# Altium footprint library GyokuRe.PcbLib: 1248 footprints (part 16 of 78)
Each footprint in its own frame and in the unit in brackets; x right, y up, seen from the top. Pads: shape width x height; smd on the part's side, far side on the other; paste and mask are expansions set on the pad; w line width, h text height; cw(c..) or ccw(c..) is an arc to the next point about the centre after c.
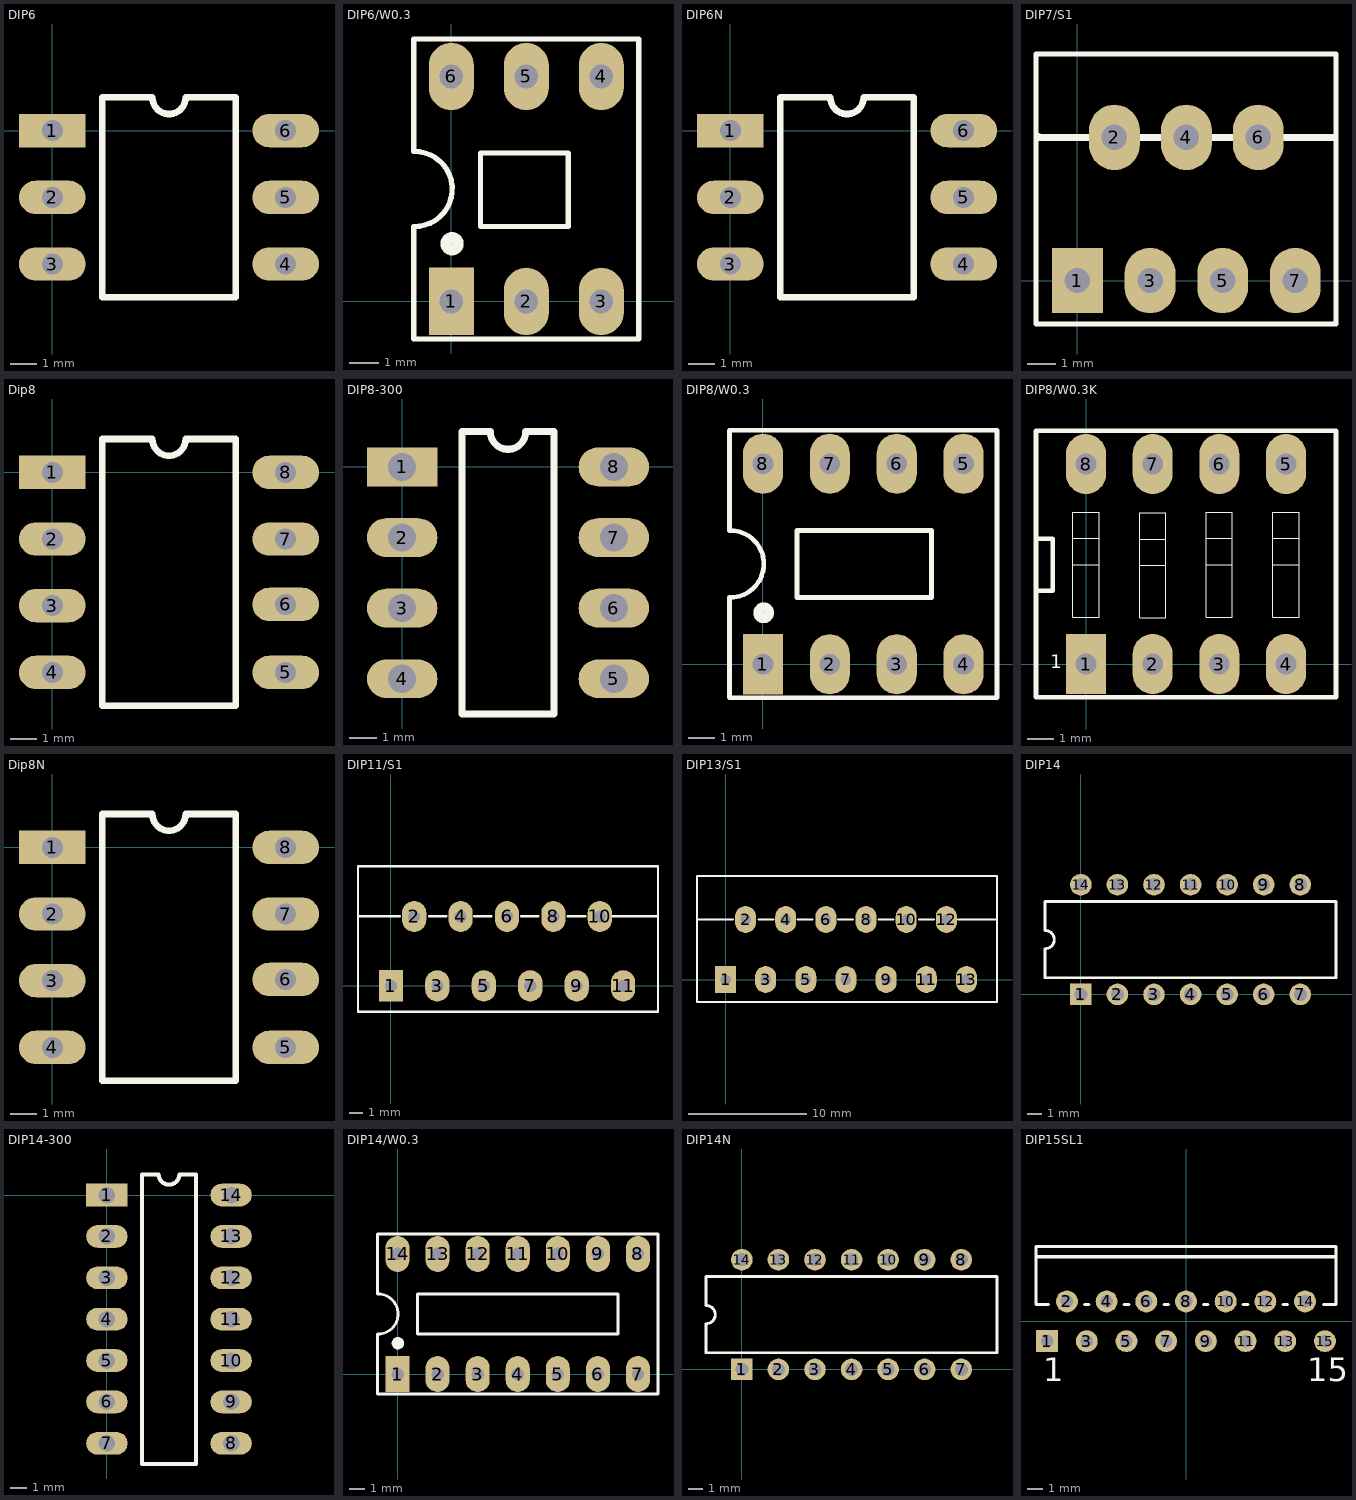
[diagram p15: the footprints below, top view; thin cyan lines are the x and y axes]

## DIP6 [mm]
pads (6):
  rect 2.54x1.27 hole 0.8: 1(0,0)
  oval 2.54x1.27 hole 0.8: 2(0,-2.54) 3(0,-5.08) 4(8.89,-5.08) 5(8.89,-2.54) 6(8.89,0)
Top Overlay:
  lines w0.254: 1.905,-6.35 6.985,-6.35 6.985,1.27 5.08,1.27 cw(c4.445,1.27) 3.81,1.27 1.905,1.27 1.905,-6.35
3D body: height 5.3, standoff 0.3, extent 1.905,-6.35 6.985,1.287
3D body: height 3, standoff 2.65, extent 0.205,-0.75 1.905,0.75
3D body: height 3, standoff 0.5, extent 0.03,-0.75 0.38,0.75
3D body: height 0.5, standoff -3.8, extent 0.03,-0.275 0.38,0.275
3D body: height 3, standoff 2.65, extent 0.205,-3.29 1.905,-1.79
3D body: height 3, standoff 0.5, extent 0.03,-3.29 0.38,-1.79
3D body: height 0.5, standoff -3.8, extent 0.03,-2.815 0.38,-2.265
3D body: height 3, standoff 2.65, extent 0.205,-5.83 1.905,-4.33
3D body: height 3, standoff 0.5, extent 0.03,-5.83 0.38,-4.33
3D body: height 0.5, standoff -3.8, extent 0.03,-5.355 0.38,-4.805
3D body: height 3, standoff 2.65, extent 6.985,-5.83 8.685,-4.33
3D body: height 3, standoff 0.5, extent 8.51,-5.83 8.86,-4.33
3D body: height 0.5, standoff -3.8, extent 8.51,-5.355 8.86,-4.805
3D body: height 3, standoff 2.65, extent 6.985,-3.29 8.685,-1.79
3D body: height 3, standoff 0.5, extent 8.51,-3.29 8.86,-1.79
3D body: height 0.5, standoff -3.8, extent 8.51,-2.815 8.86,-2.265
3D body: height 3, standoff 2.65, extent 6.985,-0.75 8.685,0.75
3D body: height 3, standoff 0.5, extent 8.51,-0.75 8.86,0.75
3D body: height 0.5, standoff -3.8, extent 8.51,-0.275 8.86,0.275
3D body: height 5.4, standoff 4, extent 3.449,0.287 5.449,1.287

## DIP6/W0.3 [mil] "6 PIN, W 300mil, Pin to pin 100mil"
height 100
pads (6):
  rect 60x90 hole 31.5: 1(0,0)
  oval 60x90 hole 31.5: 2(100,0) 3(200,0) 4(200,300) 5(100,300) 6(0,300)
Top Overlay:
  circle w15: c1,77 r8
  lines w7: -50.38,100.05 ccw(c-48.69,150.02) -50,200 ; -50,100 -50,-50 250,-50 250,350 -50,350 -50,201 ; 39,100 39,198 156,198 156,100 39,100
3D body "SW3DPS-DIP6-DEFAULT.STEP": height 169.69, standoff -129.13, extent -58.11,-7.48 260,307.48

## DIP6N [mm]
pads (6):
  rect 2.54x1.27 hole 0.8: 1(0,0)
  oval 2.54x1.27 hole 0.8: 2(0,-2.54) 3(0,-5.08) 4(8.89,-5.08) 5(8.89,-2.54) 6(8.89,0)
Top Overlay:
  lines w0.254: 1.905,-6.35 6.985,-6.35 6.985,1.27 5.08,1.27 cw(c4.445,1.27) 3.81,1.27 1.905,1.27 1.905,-6.35
3D body "DIP6.STEP": height 4.51, standoff -3.08, extent 0.475,-6.53 8.475,1.55

## DIP7/S1 [mil]
pads (7):
  rect 70x90 hole 35: 1(0,0)
  oval 70x90 hole 35: 2(51,197) 3(100,0) 4(150,197) 5(200,0) 6(249,197) 7(300,0)
Top Overlay:
  lines w7: -57,-60 -57,312 356,312 356,-60 -57,-60
  lines w10: -54,198 -54,197 354,197
3D body "User Library-TO-220(T).STEP": height 756.77, standoff -77.87, extent -50.57,-11.02 351,311.02

## Dip8 [mm] "Dual Inline Package 8 pins"
pads (8):
  rect 2.54x1.27 hole 0.8: 1(0,0)
  oval 2.54x1.27 hole 0.8: 2(0,-2.54) 3(0,-5.08) 4(0,-7.62) 5(8.89,-7.62) 6(8.89,-5.03) 7(8.89,-2.54) 8(8.89,0)
Top Overlay:
  lines w0.254: 1.905,-8.89 6.985,-8.89 6.985,1.27 5.08,1.27 cw(c4.445,1.27) 3.81,1.27 1.905,1.27 1.905,-8.89
3D body: height 0.5, standoff -3.8, extent 8.42,-7.945 8.77,-7.395
3D body: height 3, standoff 0.5, extent 8.42,-8.42 8.77,-6.92
3D body: height 3, standoff 2.65, extent 6.895,-8.37 8.595,-6.87
3D body: height 3, standoff 2.65, extent 0.205,-8.37 1.905,-6.87
3D body: height 5.3, standoff 0.3, extent 1.905,-8.89 6.985,1.27
3D body: height 3, standoff 2.65, extent 0.205,-0.75 1.905,0.75
3D body: height 3, standoff 0.5, extent 0.03,-0.75 0.38,0.75
3D body: height 0.5, standoff -3.8, extent 0.03,-0.275 0.38,0.275
3D body: height 3, standoff 2.65, extent 0.205,-3.29 1.905,-1.79
3D body: height 3, standoff 0.5, extent 0.03,-3.29 0.38,-1.79
3D body: height 0.5, standoff -3.8, extent 0.03,-2.815 0.38,-2.265
3D body: height 3, standoff 2.65, extent 0.205,-5.83 1.905,-4.33
3D body: height 3, standoff 0.5, extent 0.03,-5.83 0.38,-4.33
3D body: height 0.5, standoff -3.8, extent 0.03,-5.355 0.38,-4.805
3D body: height 3, standoff 2.65, extent 6.895,-5.83 8.595,-4.33
3D body: height 3, standoff 0.5, extent 8.42,-5.83 8.77,-4.33
3D body: height 0.5, standoff -3.8, extent 8.42,-5.355 8.77,-4.805
3D body: height 3, standoff 2.65, extent 6.895,-3.29 8.595,-1.79
3D body: height 3, standoff 0.5, extent 8.42,-3.29 8.77,-1.79
3D body: height 0.5, standoff -3.8, extent 8.42,-2.815 8.77,-2.265
3D body: height 3, standoff 2.65, extent 6.895,-0.75 8.595,0.75
3D body: height 3, standoff 0.5, extent 8.42,-0.75 8.77,0.75
3D body: height 0.5, standoff -3.8, extent 8.42,-0.275 8.77,0.275
3D body: height 0.5, standoff -3.8, extent 0.03,-7.895 0.38,-7.345
3D body: height 3, standoff 0.5, extent 0.03,-8.37 0.38,-6.87
3D body: height 5.4, standoff 4, extent 3.449,0.27 5.449,1.27

## DIP8-300 [mil]
pads (8):
  rect 100x55 hole 40: 1(0,0)
  oval 100x55 hole 40: 2(0,-100) 3(0,-200) 4(0,-300) 5(300,-300) 6(300,-200) 7(300,-100) 8(300,0)
Top Overlay:
  lines w10: 85,-350 215,-350 215,50 175,50 cw(c150,50) 125,50 85,50 85,-350
3D body "SW3DPS-DIP 8 IC-DEFAULT.STEP": height 200, standoff -137.8, extent -6.92,-360.96 302.93,68.96

## DIP8/W0.3 [mil] "8 PIN, W 300mil, Pin to pin 100mil"
height 100
pads (8):
  rect 60x90 hole 31: 1(0,0)
  oval 60x90 hole 31: 2(100,0) 3(200,0) 4(300,0) 5(300,300) 6(200,300) 7(100,300) 8(0,300)
Top Overlay:
  circle w15: c1,77 r8
  lines w7: -50.38,100.05 ccw(c-48.69,150.02) -50,200 ; -50,100 -50,-50 350,-50 350,350 -50,350 -50,201 ; 51,100 51,200 252,200 252,100 51,100
3D body "SW3dPS-DIP8-CER.STEP": height 201.25, standoff -129.47, extent -50,-40 350,336.4

## DIP8/W0.3K [mil] "8 PIN, W 400mil , L 450mil, Pin to pin 100mil For Switch"
height 100
pads (8):
  rect 60x90 hole 31: 1(0,0)
  oval 60x90 hole 31: 2(100,0) 3(200,0) 4(300,0) 5(300,300) 6(200,300) 7(100,300) 8(0,300)
Top Overlay:
  lines w1.5: -19.68,149 19.68,149 ; -19.68,188.37 19.68,188.37 ; 80.31,148 119.69,148 ; 80.31,187.37 119.69,187.37 ; 180.31,149 219.69,149 ; 180.31,188.37 219.69,188.37 ; 280.31,149 319.69,149 ; 280.31,188.37 319.69,188.37 ; -19.68,70.26 19.68,70.26 19.68,227.74 -19.68,227.74 -19.68,70.26 ; 80.31,69.26 119.69,69.26 119.69,226.74 80.31,226.74 80.31,69.26 ; 180.31,70.26 219.69,70.26 219.69,227.74 180.31,227.74 180.31,70.26 ; 280.31,70.26 319.69,70.26 319.69,227.74 280.31,227.74 280.31,70.26
  lines w7: -75,68.5 -75,233 ; -75,110 -50,110 -50,188 -74,188 -75,189 ; -75,126 -75,-50 375,-50 375,350 -75,350 -75,176
  text "1" at -54,-6 h20
3D body "switch 4bank x1.STEP": height 158.27, standoff -9.84, extent -80,-45.08 377.87,345.08

## Dip8N [mm] "Dual Inline Package 8 pins"
pads (8):
  rect 2.54x1.27 hole 0.8: 1(0,0)
  oval 2.54x1.27 hole 0.8: 2(0,-2.54) 3(0,-5.08) 4(0,-7.62) 5(8.89,-7.62) 6(8.89,-5.03) 7(8.89,-2.54) 8(8.89,0)
Top Overlay:
  lines w0.254: 1.905,-8.89 1.905,1.27 3.81,1.27 ccw(c4.445,1.27) 5.08,1.27 6.985,1.27 6.985,-8.89 1.905,-8.89
3D body "DIP8.STEP": height 5.19, standoff -1.67, extent 0.538,-9.55 8.412,1.88

## DIP11/S1 [mil] "11 Pin so le hai hang cach nhau 200mil., Pin to pin 100mil"
pads (11):
  rect 70x90 hole 35: 1(0,0)
  oval 70x90 hole 35: 2(66.93,200) 3(133.86,0) 4(200.79,200) 5(267.72,0) 6(334.65,200) 7(401.57,0) 8(468.5,200) 9(535.43,0) 10(602.36,200) 11(669.29,0)
Top Overlay:
  lines w7: -95,200 25,200 ; 110,200 160,200 ; 240,200 290,200 ; 375,200 425,200 ; 510,200 560,200 ; 630,200 770,200 ; -95,-75 -95,345 770,345 770,-75 -95,-75

## DIP13/S1 [mil] "13 Pin so le hai hang cach nhau 200mil., Pin to pin 100mil"
pads (13):
  rect 70x90 hole 35: 1(0,0)
  oval 70x90 hole 35: 2(66.93,200) 3(133.86,0) 4(200.79,200) 5(267.72,0) 6(334.65,200) 7(401.57,0) 8(468.5,200) 9(535.43,0) 10(602.36,200) 11(669.29,0) 12(736.22,200) 13(803.15,0)
Top Overlay:
  lines w7: -95,200 25,200 ; 110,200 160,200 ; 240,200 290,200 ; 375,200 425,200 ; 510,200 560,200 ; 645,200 695,200 ; 775,200 905,200 ; -95,-75 -95,345 905,345 905,-75 -95,-75

## DIP14 [mm] "DIP; 14 Leads; Row Spacing 7.62 mm; Pitch 2.54 mm"
height 4.42
pads (14):
  rect 1.5x1.5 hole 0.9: 1(0,0)
  round 1.5 hole 0.9: 2(2.54,0) 3(5.08,0) 4(7.62,0) 5(10.16,0) 6(12.7,0) 7(15.24,0) 8(15.24,7.62) 9(12.7,7.62) 10(10.16,7.62) 11(7.62,7.62) 12(5.08,7.62) 13(2.54,7.62) 14(0,7.62)
Top Overlay:
  lines w0.2: -2.48,1.16 17.72,1.16 17.72,6.46 -2.48,6.46 -2.48,4.445 cw(c-2.48,3.81) -2.48,3.175 -2.48,1.16
Bottom Overlay:
  lines w0.254: -1.475,-1.175 17,-1.175 17,8.875 -1.475,8.875 -1.475,-1.175

## DIP14-300 [mil]
pads (14):
  rect 100x55 hole 40: 1(0,0)
  oval 100x55 hole 40: 2(0,-100) 3(0,-200) 4(0,-300) 5(0,-400) 6(0,-500) 7(0,-600) 8(300,-600) 9(300,-500) 10(300,-400) 11(300,-300) 12(300,-200) 13(300,-100) 14(300,0)
Top Overlay:
  lines w10: 85,-650 215,-650 215,50 175,50 cw(c150,50) 125,50 85,50 85,-650
3D body "SW3dPS-DIP14-300.STEP": height 200, standoff -98.03, extent -4.92,-683.86 304.92,83.86

## DIP14/W0.3 [mil] "14PIN, W 300mil, Pin to pin 100mil"
height 100
pads (14):
  rect 60x90 hole 31: 1(0,0)
  oval 60x90 hole 31: 2(100,0) 3(200,0) 4(300,0) 5(400,0) 6(500,0) 7(600,0) 8(600,300) 9(500,300) 10(400,300) 11(300,300) 12(200,300) 13(100,300) 14(0,300)
Top Overlay:
  circle w15: c1,77 r8
  lines w7: -50.38,100.05 ccw(c-48.69,150.02) -50,200 ; -50,100 -50,-50 650,-50 650,350 -50,350 -50,201 ; 50,100 550,100 550,200 50,200 50,100
3D body "SW3DPS-DIP-14-DEFAULT.STEP": height 145.48, standoff -129.32, extent -69.99,-12.47 680.01,302.49

## DIP14N [mm] "DIP; 14 Leads; Row Spacing 7.62 mm; Pitch 2.54 mm"
height 4.42
pads (14):
  rect 1.5x1.5 hole 0.9: 1(0,0)
  round 1.5 hole 0.9: 2(2.54,0) 3(5.08,0) 4(7.62,0) 5(10.16,0) 6(12.7,0) 7(15.24,0) 8(15.24,7.62) 9(12.7,7.62) 10(10.16,7.62) 11(7.62,7.62) 12(5.08,7.62) 13(2.54,7.62) 14(0,7.62)
Top Overlay:
  lines w0.2: -2.48,1.16 -2.48,3.175 ccw(c-2.48,3.81) -2.48,4.445 -2.48,6.46 17.72,6.46 17.72,1.16 -2.48,1.16
Bottom Overlay:
  lines w0.254: -2.25,-1.175 -2.25,8.875 17.55,8.875 17.55,-1.175 -2.25,-1.175
3D body "DIP14-300.STEP": height 5.58, standoff -1.99, extent -2.25,-0.145 17.25,7.725

## DIP15SL1 [mm] "TO, Thru-Hole, Vertical, Heatsink Mounted; 15 Bent Staggered Leads; Pitch 1.27 mm"
height 17.3
pads (15):
  rect 1.4x1.4 hole 0.8: 1(-8.89,-1.27)
  round 1.4 hole 0.8: 2(-7.62,1.27) 3(-6.35,-1.27) 4(-5.08,1.27) 5(-3.81,-1.27) 6(-2.54,1.27) 7(-1.27,-1.27) 8(0,1.27) 9(1.27,-1.27) 10(2.54,1.27) 11(3.81,-1.27) 12(5.08,1.27) 13(6.35,-1.27) 14(7.62,1.27) 15(8.89,-1.27)
Top Overlay:
  lines w0.2: -9.6,4.13 9.6,4.13 ; -8.8,1.08 -9.6,1.08 -9.6,4.78 9.6,4.78 9.6,1.08 8.8,1.08 ; -6.5,1.08 -6.2,1.08 ; -3.96,1.08 -3.66,1.08 ; -1.42,1.08 -1.12,1.08 ; 1.12,1.08 1.42,1.08 ; 3.66,1.08 3.96,1.08 ; 6.2,1.08 6.5,1.08
  text "15" at 7.765,-3.845 h1.5
  text "1" at -9.14,-3.845 h1.5
3D body "User Library-MULTIWAT T15.step": height 22.74, standoff -2.18, extent -9.8,-1.778 9.8,7.29